# Altium footprint library Connectors.PcbLib: 268 footprints (part 19 of 21)
Each footprint in its own frame and in the unit in brackets; x right, y up, seen from the top. Pads: shape width x height; smd on the part's side, far side on the other; paste and mask are expansions set on the pad; w line width, h text height; cw(c..) or ccw(c..) is an arc to the next point about the centre after c.
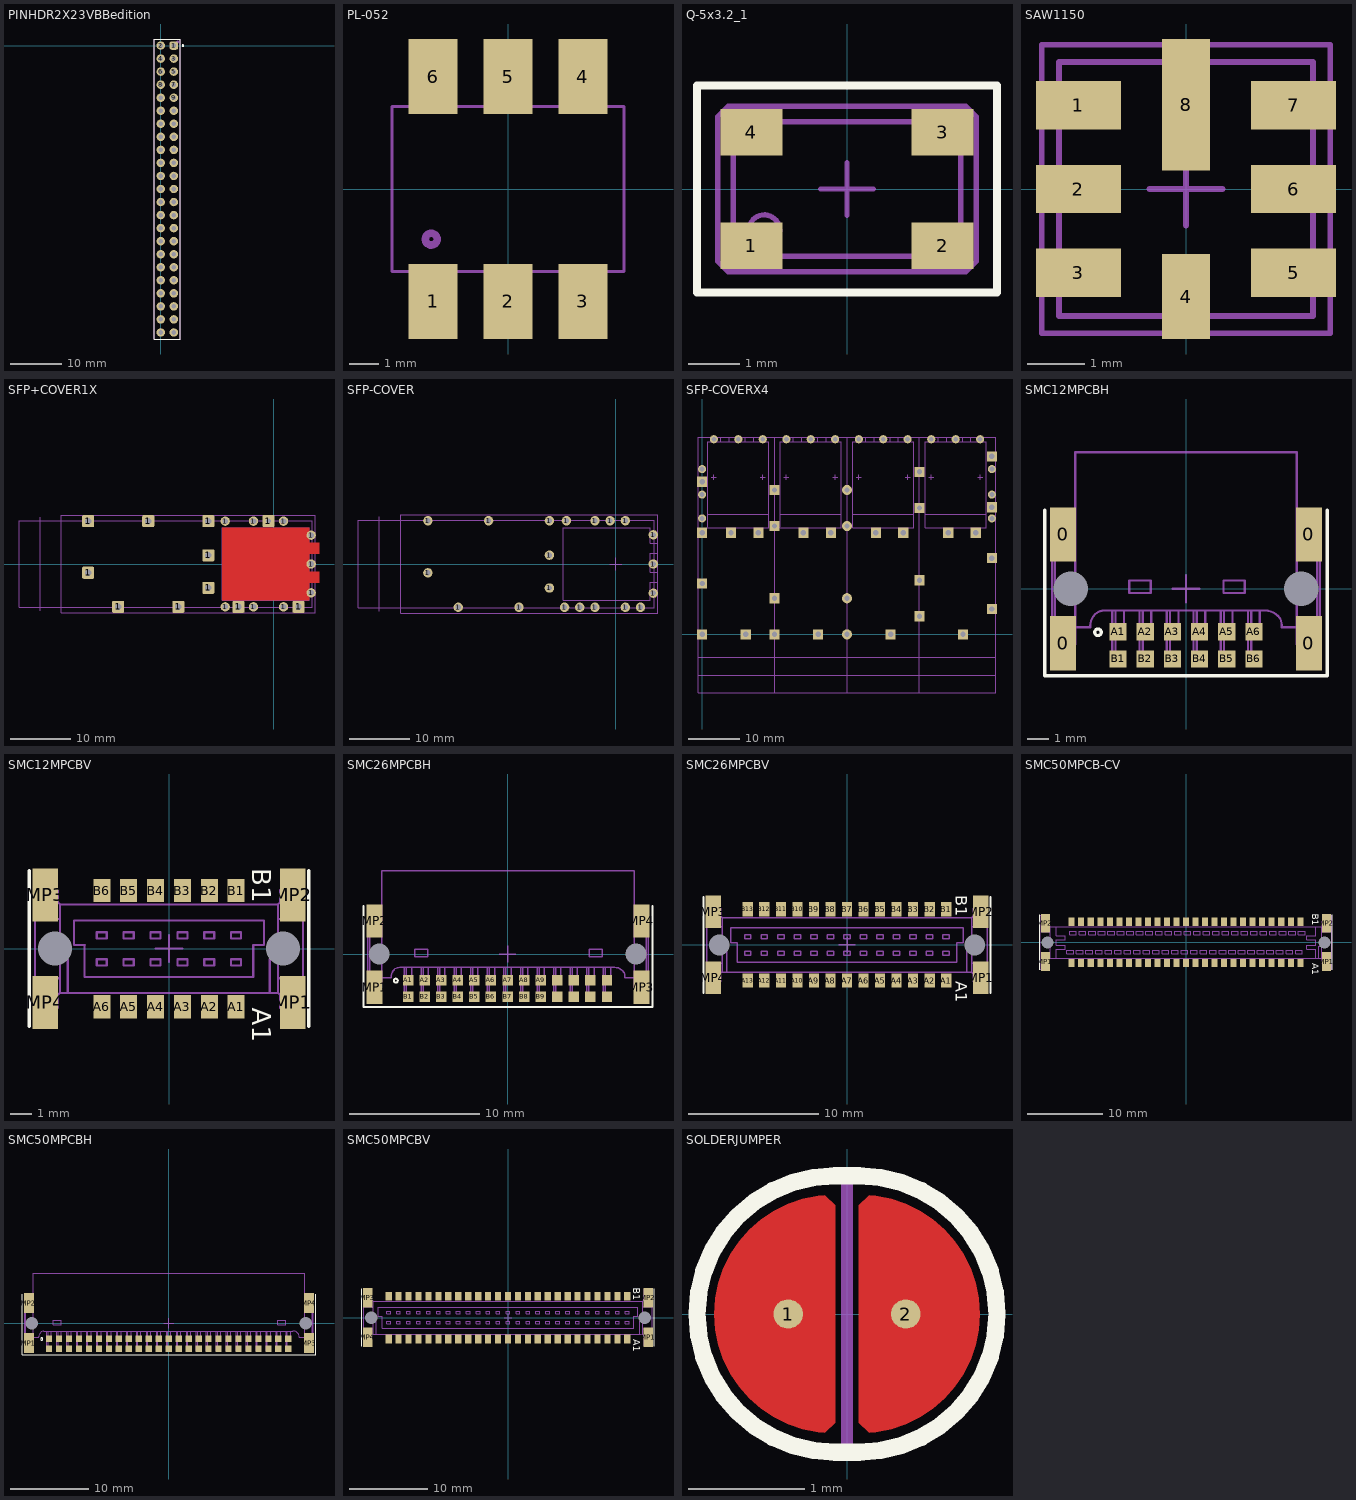
[diagram p18: the footprints below, top view; thin cyan lines are the x and y axes]

## PINHDR2X23VBBedition [mil] "Pin header 2x23 pin R2.54mm"
height 433.07
pads (46):
  rrect50% 65x65 hole 35.43 paste-50: 1(100,0)
  round 65 hole 35.43 paste-50: 2(0,0) 3(100,-100) 4(0,-100) 5(100,-200) 6(0,-200) 7(100,-300) 8(0,-300) 9(100,-400) 10(0,-400) 11(100,-500) 12(0,-500) 13(100,-600) 14(0,-600) 15(100,-700) 16(0,-700) 17(100,-800) 18(0,-800) 19(100,-900) 20(0,-900) 21(100,-1000) 22(0,-1000) 23(100,-1100) 24(0,-1100) 25(100,-1200) 26(0,-1200) 27(100,-1300) 28(0,-1300) 29(100,-1400) 30(0,-1400) 31(100,-1500) 32(0,-1500) 33(100,-1600) 34(0,-1600) 35(100,-1700) 36(0,-1700) 37(100,-1800) 38(0,-1800) 39(100,-1900) 40(0,-1900) 41(100,-2000) 42(0,-2000) 43(100,-2100) 44(0,-2100) 45(100,-2200) 46(0,-2200)
Top Overlay:
  circle w5.91: c170,0 r6
  lines w5.91: -50,-2250 -50,50 150,50 150,-2250 -50,-2250
Mechanical 13:
  drawing of 189 lines, arcs and shapes, not listed
3D body: height 314.96, standoff -125.98, extent 87,-1913 113,-1887
3D body: height 314.96, standoff -125.98, extent -13,-1913 13,-1887
3D body: height 314.96, standoff -125.98, extent -13,-1813 13,-1787
3D body: height 314.96, standoff -125.98, extent 87,-1813 113,-1787
3D body: height 314.96, standoff -125.98, extent -13,-1713 13,-1687
3D body: height 314.96, standoff -125.98, extent 87,-1713 113,-1687
3D body: height 314.96, standoff -125.98, extent -13,-1613 13,-1587
3D body: height 314.96, standoff -125.98, extent 87,-1613 113,-1587
3D body: height 314.96, standoff -125.98, extent -13,-1513 13,-1487
3D body: height 314.96, standoff -125.98, extent 87,-1513 113,-1487
3D body: height 314.96, standoff -125.98, extent -13,-1413 13,-1387
3D body: height 314.96, standoff -125.98, extent 87,-1413 113,-1387
3D body: height 314.96, standoff -125.98, extent -13,-1313 13,-1287
3D body: height 314.96, standoff -125.98, extent 87,-1313 113,-1287
3D body: height 314.96, standoff -125.98, extent -13,-1213 13,-1187
3D body: height 314.96, standoff -125.98, extent 87,-1213 113,-1187
3D body: height 314.96, standoff -125.98, extent -13,-1113 13,-1087
3D body: height 314.96, standoff -125.98, extent 87,-1113 113,-1087
3D body: height 314.96, standoff -125.98, extent -13,-1013 13,-987
3D body: height 314.96, standoff -125.98, extent 87,-1013 113,-987
3D body: height 314.96, standoff -125.98, extent -13,-913 13,-887
3D body: height 314.96, standoff -125.98, extent 87,-913 113,-887
3D body: height 314.96, standoff -125.98, extent -13,-813 13,-787
3D body: height 314.96, standoff -125.98, extent 87,-813 113,-787
3D body: height 314.96, standoff -125.98, extent -13,-713 13,-687
3D body: height 314.96, standoff -125.98, extent 87,-713 113,-687
3D body: height 314.96, standoff -125.98, extent -13,-613 13,-587
3D body: height 314.96, standoff -125.98, extent 87,-613 113,-587
3D body: height 314.96, standoff -125.98, extent -13,-513 13,-487
3D body: height 314.96, standoff -125.98, extent 87,-513 113,-487
3D body: height 314.96, standoff -125.98, extent -13,-413 13,-387
3D body: height 314.96, standoff -125.98, extent 87,-413 113,-387
3D body: height 314.96, standoff -125.98, extent -13,-313 13,-287
3D body: height 314.96, standoff -125.98, extent 87,-313 113,-287
3D body: height 314.96, standoff -125.98, extent -13,-213 13,-187
3D body: height 314.96, standoff -125.98, extent 87,-213 113,-187
3D body: height 314.96, standoff -125.98, extent -13,-113 13,-87
3D body: height 314.96, standoff -125.98, extent 87,-113 113,-87
3D body: height 100, standoff 0, extent -50,-2250 150,50
3D body: height 314.96, standoff -125.98, extent 87,-13 113,13
3D body: height 314.96, standoff -125.98, extent -13,-13 13,13
3D body: height 314.96, standoff -125.98, extent -13,-2013 13,-1987
3D body: height 314.96, standoff -125.98, extent 87,-2013 113,-1987
3D body: height 314.96, standoff -125.98, extent -13,-2113 13,-2087
3D body: height 314.96, standoff -125.98, extent 87,-2113 113,-2087
3D body: height 314.96, standoff -125.98, extent -13,-2213 13,-2187
3D body: height 314.96, standoff -125.98, extent 87,-2213 113,-2187

## PL-052 [mm] "RF Mixer"
height 2.84
pads (6):
  rect 1.65x2.54 smd: 1(-2.54,-3.81) 2(0,-3.81) 3(2.54,-3.81) 4(2.54,3.81) 5(0,3.81) 6(-2.54,3.81)
Mechanical 13:
  circle w0.254: c-2.6,-1.7 r0.2
  lines w0.102: -3.935,-2.795 3.935,-2.795 3.935,2.795 -3.935,2.795 -3.935,-2.795
3D body: height 2.84, standoff 0, extent -3.935,-2.795 3.935,2.795
3D body: height 2.85, standoff 2.84, extent -3.1,-2.2 -2.104,-1.202

## Q-5x3.2_1 [mm] "Quartz crystal 5x3.2x1.05mm"
height 1.05
pads (4):
  rect 1.2x0.9 smd: 1(-1.85,-1.1) 2(1.85,-1.1) 3(1.85,1.1) 4(-1.85,1.1)
Top Overlay:
  lines w0.15: -2.9,-2 2.9,-2 2.9,2 -2.9,2 -2.9,-2
Mechanical 13:
  circle w0.102: c-1.6,-0.8 r0.3
  lines w0.102: -2.5,-1.4 -2.5,1.4 -2.3,1.6 2.3,1.6 2.5,1.4 2.5,-1.4 2.3,-1.6 -2.3,-1.6 -2.5,-1.4 ; -2.2,-1.3 -2.2,1.3 2.2,1.3 2.2,-1.3 -2.2,-1.3
Mechanical 15:
  lines w0.102: -0.508,0 0.508,0 ; 0,-0.508 0,0.508
3D body: height 0.4, standoff 0, extent -2.5,-1.6 2.5,1.6
3D body: height 1.05, standoff 0.4, extent -2.2,-1.3 2.2,1.3
3D body: height 0.81, standoff 0.8, extent -2,-1.025 -1.5,-0.525
3D body: height 1.06, standoff 1.05, extent -1.9,-1.1 -1.3,-0.5

## RFTRF-KK81 [mm]
height 6.6

## SAW1150 [mm] "SAW filter 8 pin 5MM; R1.27mm"
height 1
pads (8):
  rect 1.47x0.84 smd: 1(-1.865,1.45) 2(-1.865,0) 3(-1.865,-1.45) 5(1.865,-1.45) 6(1.865,0) 7(1.865,1.45)
  rect 0.84x1.47 smd: 4(0,-1.865)
  rect 0.84x2.28 smd: 8(0,1.46)
Mechanical 13:
  lines w0.102: -2.5,-2.5 2.5,-2.5 2.5,2.5 -2.5,2.5 -2.5,-2.5
Mechanical 15:
  lines w0.102: -0.635,0 0.635,0 ; 0,-0.635 0,0.635 ; -2.2,-2.2 -2.2,2.2 2.2,2.2 2.2,-2.2 -2.2,-2.2
3D body: height 1.5, standoff 0, extent -2.5,-2.5 2.5,2.5
3D body: height 1.7, standoff 1.5, extent -2.2,-2.2 2.2,2.2
3D body: height 1.71, standoff 1.7, extent -1.798,1.201 -1.2,1.799

## SFP+COVER1X [mm] "SFP+ Cage Tyco 2007198-1"
height 10.4
pads (20):
  rrect20% 2x2 hole 1.05: 1(-30.9,-1.455) 1(-30.9,7.125) 1(-25.9,-7.125) 1(-20.9,7.125) 1(-15.9,-7.125) 1(-10.9,-3.955) 1(-10.9,1.445) 1(-10.9,7.125) 1(-5.9,-7.125) 1(4.1,-7.125)
  round 1.55 hole 0.95: 1(-8.1,-7.125) 1(-8.1,7.125) 1(-3.4,-7.125) 1(-3.4,7.125) 1(1.6,-7.125) 1(1.6,7.125) 1(6.2,-4.8) 1(6.2,0) 1(6.2,4.8)
  rrect20% 2x2 hole 0.85: 1(-0.9,7.125)
Top Layer:
  pour cut-out: 7.5,3.5 7.5,1.7 5.9,1.7 5.9,-1.3 7.5,-1.3 7.5,-3.1 5.9,-3.1 5.9,-6 -8.6,-6 -8.6,6 5.9,6 5.9,3.5
Mechanical 13:
  lines w0.102: -42.4,-7.2 6.35,-7.2 6.35,7.2 -42.4,7.2 -42.4,-7.2
Mechanical 15:
  lines w0.102: -38.9,-7.8 -38.9,7.8 ; -1,0 1,0 ; 0,-1 0,1 ; 6.9,-3 5.9,-3 5.9,-6 -8.6,-6 -8.6,3.8 -8.6,6 5.9,6 5.9,3.45 6.9,3.45 ; 6.9,-1.35 5.9,-1.35 5.9,1.75 6.9,1.75 ; -35.4,-8.1 -35.4,-7.2 -35.4,7.2 -35.4,8.1 6.9,8.1 6.9,-8.1 -35.4,-8.1
  text "CNSFP20" at -1,-4.3 h1.3
  text "center for" at -2.7,-6 h1.3
  text "PPL" at -37.2,-1.5 h1.4
  text "PCB" at -33.5,-1.9 h1.4
  text "GND only" at -18.1,-5.1 h1.3
3D body "c-2007198-1-a-3d.stp": height 10.47, standoff -2.98, extent -42.4,-8.008 6.4,8.008

## SFP-COVER [mm]
pads (20):
  round 1.55 hole 0.85: 1(-30.9,-1.45) 1(-30.9,7.125) 1(-25.9,-7.125) 1(-20.9,7.125) 1(-15.9,-7.125) 1(-10.9,-3.95) 1(-10.9,1.45) 1(-10.9,7.125) 1(-8.4,-7.125) 1(-8.1,7.125) 1(-5.9,-7.125) 1(-3.4,-7.125) 1(-3.4,7.125) 1(-0.9,7.125) 1(1.6,-7.125) 1(1.6,7.125) 1(4.1,-7.125) 1(6.2,-4.8) 1(6.2,0) 1(6.2,4.8)
Mechanical 13:
  lines w0.102: -42.4,-7.2 6.35,-7.2 6.35,7.2 -42.4,7.2 -42.4,-7.2
Mechanical 15:
  lines w0.102: -38.9,-7.8 -38.9,7.8 ; -1,0 1,0 ; 0,-1 0,1 ; 6.9,-3 5.7,-3 5.7,-6 -8.6,-6 -8.6,3.8 -8.6,6 5.7,6 5.7,3.45 6.9,3.45 ; 6.9,-1.35 5.7,-1.35 5.7,1.75 6.9,1.75 ; -35.4,-8.1 -35.4,-7.2 -35.4,7.2 -35.4,8.1 6.9,8.1 6.9,-8.1 -35.4,-8.1
  text "CNSFP20" at -1,-4.3 h1.3
  text "center for" at -2.7,-6 h1.3
  text "PPL" at -37.2,-1.5 h1.4
  text "PCB" at -33.5,-1.9 h1.4
  text "GND only" at -18.1,-5.1 h1.3
3D body: height 9.25, standoff 0.3, extent -42.4,-7.2 6.35,7.2
3D body: height 9.55, standoff 9.25, extent -42.4,-7.2 6.35,7.2
3D body: height 0.3, standoff 0, extent -42.4,-7.2 6.35,7.2

## SFP-COVERX4 [mm]
pads (50):
  rect 2x2 hole 1.05: MH1(0,0) MH1(0,10) MH1(0,20) MH1(0,30) MH1(5.675,20) MH1(8.575,0) MH1(11.075,20) MH1(14.25,0) MH1(14.25,7.1) MH1(14.25,21.3) MH1(14.25,28.4) MH1(19.925,20) MH1(22.825,0) MH1(25.325,20) MH1(34.175,20) MH1(37.075,0) MH1(39.575,20) MH1(42.75,3.55) MH1(42.75,10.65) MH1(42.75,24.85) MH1(42.75,31.95) MH1(48.425,20) MH1(51.325,0) MH1(53.825,20) MH1(57,5) MH1(57,15) MH1(57,25) MH1(57,35)
  round 1.6 hole 0.95: MH1(0,22.8) MH1(0,27.5) MH1(0,32.5) MH1(2.325,38.375) MH1(7.125,38.375) MH1(11.925,38.375) MH1(16.575,38.375) MH1(21.375,38.375) MH1(26.175,38.375) MH1(30.825,38.375) MH1(35.625,38.375) MH1(40.425,38.375) MH1(45.075,38.375) MH1(49.875,38.375) MH1(54.675,38.375) MH1(57,22.8) MH1(57,27.5) MH1(57,32.5)
  round 2 hole 1.05: MH1(28.5,0) MH1(28.5,7.1) MH1(28.5,21.3) MH1(28.5,28.4)
Mechanical 13:
  lines w0.127: 14.25,-11.5 14.25,38.8 ; 28.5,-11.5 28.5,38.8 ; 42.75,-11.5 42.75,38.8 ; -0.8,-11.5 57.8,-11.5 57.8,38.8 -0.8,38.8 -0.8,-11.5 ; 1,21 1.125,21.125 1.125,37.875 13.125,37.875 13.125,21 1,21 ; 15.25,21 15.375,21.125 15.375,37.875 27.375,37.875 27.375,21 15.25,21 ; 29.625,21 41.625,21 41.625,37.875 29.625,37.875 29.625,21 ; 43.875,21 55.875,21 55.875,37.875 43.875,37.875 43.875,21
Mechanical 15:
  lines w0.102: 3.675,38.8 3.675,37.875 1.125,37.875 1.125,23.575 3.325,23.575 13.125,23.575 13.125,37.875 10.125,37.875 10.125,38.8 ; 5.375,38.8 5.375,37.875 8.475,37.875 8.475,38.8 ; 17.925,38.8 17.925,37.875 15.375,37.875 15.375,23.575 17.575,23.575 27.375,23.575 27.375,37.875 24.375,37.875 24.375,38.8 ; 19.625,38.8 19.625,37.875 22.725,37.875 22.725,38.8 ; 32.175,38.8 32.175,37.875 29.625,37.875 29.625,23.575 31.825,23.575 41.625,23.575 41.625,37.875 38.625,37.875 38.625,38.8 ; 33.875,38.8 33.875,37.875 36.975,37.875 36.975,38.8 ; 46.425,38.8 46.425,37.875 43.875,37.875 43.875,23.575 46.075,23.575 55.875,23.575 55.875,37.875 52.875,37.875 52.875,38.8 ; 48.125,38.8 48.125,37.875 51.225,37.875 51.225,38.8
  lines w0.127: -0.8,-8 57.8,-8 ; 1.825,30.9 2.825,30.9 ; 2.325,30.4 2.325,31.4 ; 11.425,30.9 12.425,30.9 ; 11.925,30.4 11.925,31.4 ; 16.075,30.9 17.075,30.9 ; 16.575,30.4 16.575,31.4 ; 25.675,30.9 26.675,30.9 ; 26.175,30.4 26.175,31.4 ; 30.325,30.9 31.325,30.9 ; 30.825,30.4 30.825,31.4 ; 39.925,30.9 40.925,30.9 ; 40.425,30.4 40.425,31.4 ; 44.575,30.9 45.575,30.9 ; 45.075,30.4 45.075,31.4 ; 54.175,30.9 55.175,30.9 ; 54.675,30.4 54.675,31.4 ; -0.8,-4.5 57.8,-4.5 57.8,38.8 -0.8,38.8 -0.8,-4.5
  text "Front Panel inner edge" at 43.1,-6.3 h1.3
  text "GND only" at 12.1,11.7 h1.3
  text "center for" at 13,27.1 h1.3
  text "CNSFP20" at 11.3,28.8 h1.3
  text "CNSFP20" at 25.55,28.8 h1.3
  text "center for" at 27.25,27.1 h1.3
  text "GND only" at 26.35,11.7 h1.3
  text "CNSFP20" at 39.8,28.8 h1.3
  text "center for" at 41.5,27.1 h1.3
  text "GND only" at 40.6,11.7 h1.3
  text "CNSFP20" at 54.05,28.8 h1.3
  text "center for" at 55.75,27.1 h1.3
  text "GND only" at 54.85,11.7 h1.3
  text "PCB edge" at 33.2,-2.7 h1.3
3D body "c-1658744-1-e1-3d.stp": height 10.38, standoff -2.03, extent -0.787,-11.5 57.8,38.75

## SMC12MPCBH [mm] "ERNI SMC12 pin MALE HOR"
height 4.2
pads (18):
  rect 1.219x2.54 smd: 0(-5.74,-2.54) 0(-5.74,2.54) 0(5.74,-2.54) 0(5.74,2.54)
  rect 0.8x0.8 smd: A1(-3.175,-2.007) A2(-1.905,-2.007) A3(-0.635,-2.007) A4(0.635,-2.007) A5(1.905,-2.007) A6(3.175,-2.007) B1(-3.175,-3.277) B2(-1.905,-3.277) B3(-0.635,-3.277) B4(0.635,-3.277) B5(1.905,-3.277) B6(3.175,-3.277)
  round 0 hole 1.6 unplated: MH1(-5.385,0) MH2(5.385,0)
Top Overlay:
  circle w0.15: c-4.115,-2.032 r0.152
  lines w0.15: -6.604,3.683 -6.604,-4.064 6.604,-4.064 6.604,3.683
Mechanical 13:
  lines w0.102: -5.175,-1.419 -6.125,-1.419 -6.125,1.381 -5.175,1.381 ; -5.175,3.581 -6.25,3.581 -6.25,-3.619 -5.275,-3.619 -5.275,-2.694 -5.175,-2.594 -5.175,-1.794 ; -3.45,-1.019 -3.45,-3.519 -2.9,-3.519 -2.9,-3.019 -3.3,-3.019 ; -3.3,-3.519 -3.3,-1.019 ; -3.3,-2.244 -2.9,-2.244 -2.9,-1.019 ; -3.3,-1.819 -2.9,-1.819 ; -2.175,-1.019 -2.175,-3.519 -1.625,-3.519 -1.625,-3.019 -2.025,-3.019 ; -2.025,-3.519 -2.025,-1.019 ; -2.025,-2.244 -1.625,-2.244 -1.625,-1.019 ; -2.025,-1.819 -1.625,-1.819 ; -0.9,-1.019 -0.9,-3.519 -0.35,-3.519 -0.35,-3.019 -0.75,-3.019 ; -0.75,-3.519 -0.75,-1.019 ; -0.75,-2.244 -0.35,-2.244 -0.35,-1.019 ; -0.75,-1.819 -0.35,-1.819 ; 0.35,-1.019 0.35,-3.519 0.9,-3.519 0.9,-3.019 0.5,-3.019 ; 0.5,-3.519 0.5,-1.019 ; 0.5,-2.244 0.9,-2.244 0.9,-1.019 ; 0.5,-1.819 0.9,-1.819 ; 1.625,-1.019 1.625,-3.519 2.175,-3.519 2.175,-3.019 1.775,-3.019 ; 1.775,-3.519 1.775,-1.019 ; 1.775,-2.244 2.175,-2.244 2.175,-1.019 ; 1.775,-1.819 2.175,-1.819 ; 2.9,-1.019 2.9,-3.519 3.45,-3.519 3.45,-3.019 3.05,-3.019 ; 3.05,-3.519 3.05,-1.019 ; 3.05,-2.244 3.45,-2.244 3.45,-1.019 ; 3.05,-1.819 3.45,-1.819 ; 5.175,-1.419 6.125,-1.419 6.125,1.381 5.175,1.381 ; 5.175,3.581 6.25,3.581 6.25,-3.619 5.275,-3.619 5.275,-2.694 5.175,-2.594 5.175,-1.794 ; -5.175,-1.794 -4.475,-1.794 -4.475,-1.737 cw(c-3.707,-1.737) -4.25,-1.194 cw(c-3.828,-1.616) -3.828,-1.019 3.696,-1.019 cw(c3.696,-1.873) 4.3,-1.269 cw(c3.878,-1.691) 4.475,-1.691 4.475,-1.794 5.175,-1.794 ; -5.175,-1.794 -5.175,6.381 5.175,6.381 5.175,-1.794 ; -2.65,-0.194 -2.65,0.381 -1.65,0.381 -1.65,-0.194 -2.65,-0.194 ; 1.75,-0.194 1.75,0.381 2.75,0.381 2.75,-0.194 1.75,-0.194
Mechanical 15:
  lines w0.102: -0.635,0 0.635,0 ; 0,-0.635 0,0.635
3D body "SMC12MH.stp": height 4.27, standoff -0.68, extent -6.285,-3.625 6.285,6.375

## SMC12MPCBV [mm] "ERNI SMC12 pin MALE VERT"
height 8
pads (18):
  rect 0.8x1.1 smd: A1(3.175,-2.743) A2(1.905,-2.743) A3(0.635,-2.743) A4(-0.635,-2.743) A5(-1.905,-2.743) A6(-3.175,-2.743) B1(3.175,2.743) B2(1.905,2.743) B3(0.635,2.743) B4(-0.635,2.743) B5(-1.905,2.743) B6(-3.175,2.743)
  round 0 hole 1.6 unplated: MH1(-5.385,0) MH2(5.385,0)
  rect 1.2x2.5 smd: MP1(5.842,-2.54) MP2(5.842,2.54) MP3(-5.842,2.54) MP4(-5.842,-2.54)
Top Overlay:
  lines w0.15: -6.604,-3.683 -6.604,3.683 ; 6.604,-3.683 6.604,3.683
  text "A1" at 3.937,-2.794 h0.89
  text "B1" at 3.937,3.81 h0.89
Mechanical 13:
  lines w0.102: -6.335,-1.4 -5.16,-1.4 ; -6.335,1.4 -5.16,1.4 ; -5.16,-0.525 -4.785,-0.525 -4.785,-2.1 ; -5.156,-2.1 5.16,-2.1 ; -5.156,2.083 5.16,2.083 ; -4.485,1.325 -4.485,0.175 -3.985,0.175 ; -4.47,1.325 4.485,1.325 4.485,0.175 3.985,0.175 3.985,-1.35 -3.988,-1.35 ; -3.988,-1.346 -3.988,0.178 ; 4.76,-2.1 4.76,-0.5 5.16,-0.5 ; 5.16,-1.4 6.335,-1.4 ; 5.16,1.4 6.335,1.4 ; 5.16,-2.1 5.16,2.1 5.26,2.2 5.26,2.775 5.335,2.85 5.335,3.6 6.335,3.6 6.335,-3.6 5.335,-3.6 5.335,-2.875 5.26,-2.8 5.26,-2.2 5.16,-2.1 ; -6.335,-3.6 -6.335,3.6 -5.335,3.6 -5.335,2.85 -5.26,2.775 -5.26,2.2 -5.16,2.1 -5.16,-2.1 -5.26,-2.2 -5.26,-2.8 -5.335,-2.875 -5.335,-3.6 -6.335,-3.6 ; -3.415,-0.8 -3.415,-0.5 -2.94,-0.5 -2.94,-0.8 -3.415,-0.8 ; -3.415,0.475 -2.94,0.475 -2.94,0.775 -3.415,0.775 -3.415,0.475 ; -2.145,-0.8 -2.145,-0.5 -1.67,-0.5 -1.67,-0.8 -2.145,-0.8 ; -2.145,0.475 -1.67,0.475 -1.67,0.775 -2.145,0.775 -2.145,0.475 ; -0.875,-0.8 -0.875,-0.5 -0.4,-0.5 -0.4,-0.8 -0.875,-0.8 ; -0.875,0.475 -0.4,0.475 -0.4,0.775 -0.875,0.775 -0.875,0.475 ; 0.395,-0.8 0.395,-0.5 0.87,-0.5 0.87,-0.8 0.395,-0.8 ; 0.395,0.475 0.87,0.475 0.87,0.775 0.395,0.775 0.395,0.475 ; 1.665,-0.8 1.665,-0.5 2.14,-0.5 2.14,-0.8 1.665,-0.8 ; 1.665,0.475 2.14,0.475 2.14,0.775 1.665,0.775 1.665,0.475 ; 2.935,-0.8 3.41,-0.8 3.41,-0.5 2.935,-0.5 2.935,-0.8 ; 2.935,0.475 2.935,0.775 3.41,0.775 3.41,0.475 2.935,0.475
Mechanical 15:
  lines w0.102: -0.635,0 0.635,0 ; 0,-0.635 0,0.635
3D body "154818_NEU.stp": height 6.75, standoff -0.75, extent -6.35,-3.6 6.35,3.6

## SMC26MPCBH [mm] "ERNI SMC26 pin MALE HOR"
height 4.2
pads (32):
  rect 0.8x0.8 smd: A1(-7.62,-2.007) A2(-6.35,-2.007) A3(-5.08,-2.007) A4(-3.81,-2.007) A5(-2.54,-2.007) A6(-1.27,-2.007) A7(0,-2.007) A8(1.27,-2.007) A9(2.54,-2.007) A10(3.81,-2.007) A11(5.08,-2.007) A12(6.35,-2.007) A13(7.62,-2.007) B1(-7.62,-3.277) B2(-6.35,-3.277) B3(-5.08,-3.277) B4(-3.81,-3.277) B5(-2.54,-3.277) B6(-1.27,-3.277) B7(0,-3.277) B8(1.27,-3.277) B9(2.54,-3.277) B10(3.81,-3.277) B11(5.08,-3.277) B12(6.35,-3.277) B13(7.62,-3.277)
  round 0 hole 1.6 unplated: MH1(-9.83,0) MH2(9.83,0)
  rect 1.219x2.54 smd: MP1(-10.185,-2.54) MP2(-10.185,2.54) MP3(10.255,-2.54) MP4(10.255,2.54)
Top Overlay:
  circle w0.15: c-8.56,-2.032 r0.152
  lines w0.15: -11.049,3.683 -11.049,-4.064 11.119,-4.064 11.119,3.683
Mechanical 13:
  lines w0.102: -9.62,-1.419 -10.57,-1.419 -10.57,1.381 -9.62,1.381 ; -9.62,3.581 -10.695,3.581 -10.695,-3.619 -9.72,-3.619 -9.72,-2.694 -9.62,-2.594 -9.62,-1.794 ; -7.895,-1.019 -7.895,-3.519 -7.345,-3.519 -7.345,-3.019 -7.745,-3.019 ; -7.745,-3.519 -7.745,-1.019 ; -7.745,-2.244 -7.345,-2.244 -7.345,-1.019 ; -7.745,-1.819 -7.345,-1.819 ; -6.62,-1.019 -6.62,-3.519 -6.07,-3.519 -6.07,-3.019 -6.47,-3.019 ; -6.47,-3.519 -6.47,-1.019 ; -6.47,-2.244 -6.07,-2.244 -6.07,-1.019 ; -6.47,-1.819 -6.07,-1.819 ; -5.345,-1.019 -5.345,-3.519 -4.795,-3.519 -4.795,-3.019 -5.195,-3.019 ; -5.195,-3.519 -5.195,-1.019 ; -5.195,-2.244 -4.795,-2.244 -4.795,-1.019 ; -5.195,-1.819 -4.795,-1.819 ; -4.095,-1.019 -4.095,-3.519 -3.545,-3.519 -3.545,-3.019 -3.945,-3.019 ; -3.945,-3.519 -3.945,-1.019 ; -3.945,-2.244 -3.545,-2.244 -3.545,-1.019 ; -3.945,-1.819 -3.545,-1.819 ; -2.82,-1.019 -2.82,-3.519 -2.27,-3.519 -2.27,-3.019 -2.67,-3.019 ; -2.67,-3.519 -2.67,-1.019 ; -2.67,-2.244 -2.27,-2.244 -2.27,-1.019 ; -2.67,-1.819 -2.27,-1.819 ; -1.545,-1.019 -1.545,-3.519 -0.995,-3.519 -0.995,-3.019 -1.395,-3.019 ; -1.395,-3.519 -1.395,-1.019 ; -1.395,-2.244 -0.995,-2.244 -0.995,-1.019 ; -1.395,-1.819 -0.995,-1.819 ; -0.275,-1.019 -0.275,-3.519 0.275,-3.519 0.275,-3.019 -0.125,-3.019 ; -0.125,-3.519 -0.125,-1.019 ; -0.125,-2.244 0.275,-2.244 0.275,-1.019 ; -0.125,-1.819 0.275,-1.819 ; 1,-1.019 1,-3.519 1.55,-3.519 1.55,-3.019 1.15,-3.019 ; 1.15,-3.519 1.15,-1.019 ; 1.15,-2.244 1.55,-2.244 1.55,-1.019 ; 1.15,-1.819 1.55,-1.819 ; 2.275,-1.019 2.275,-3.519 2.825,-3.519 2.825,-3.019 2.425,-3.019 ; 2.425,-3.519 2.425,-1.019 ; 2.425,-2.244 2.825,-2.244 2.825,-1.019 ; 2.425,-1.819 2.825,-1.819 ; 3.525,-1.019 3.525,-3.519 4.075,-3.519 4.075,-3.019 3.675,-3.019 ; 3.675,-3.519 3.675,-1.019 ; 3.675,-2.244 4.075,-2.244 4.075,-1.019 ; 3.675,-1.819 4.075,-1.819 ; 4.8,-1.019 4.8,-3.519 5.35,-3.519 5.35,-3.019 4.95,-3.019 ; 4.95,-3.519 4.95,-1.019 ; 4.95,-2.244 5.35,-2.244 5.35,-1.019 ; 4.95,-1.819 5.35,-1.819 ; 6.075,-1.019 6.075,-3.519 6.625,-3.519 6.625,-3.019 6.225,-3.019 ; 6.225,-3.519 6.225,-1.019 ; 6.225,-2.244 6.625,-2.244 6.625,-1.019 ; 6.225,-1.819 6.625,-1.819 ; 7.345,-1.019 7.345,-3.519 7.895,-3.519 7.895,-3.019 7.495,-3.019 ; 7.495,-3.519 7.495,-1.019 ; 7.495,-2.244 7.895,-2.244 7.895,-1.019 ; 7.495,-1.819 7.895,-1.819 ; 9.69,-1.419 10.64,-1.419 10.64,1.381 9.69,1.381 ; 9.69,3.581 10.765,3.581 10.765,-3.619 9.79,-3.619 9.79,-2.694 9.69,-2.594 9.69,-1.794 ; -9.62,-1.794 -8.92,-1.794 -8.92,-1.737 cw(c-8.152,-1.737) -8.695,-1.194 cw(c-8.273,-1.616) -8.273,-1.019 8.211,-1.019 cw(c8.211,-1.873) 8.815,-1.269 cw(c8.393,-1.691) 8.99,-1.691 8.99,-1.794 9.69,-1.794 ; -9.62,-1.794 -9.62,6.381 9.69,6.381 9.69,-1.794 ; -7.095,-0.194 -7.095,0.381 -6.095,0.381 -6.095,-0.194 -7.095,-0.194 ; 6.265,-0.194 7.265,-0.194 7.265,0.381 6.265,0.381 6.265,-0.194
Mechanical 15:
  lines w0.102: -0.635,0 0.635,0 ; 0,-0.635 0,0.635
3D body "SMC-054595.stp": height 4.27, standoff -0.68, extent -10.73,-3.599 10.73,6.401

## SMC26MPCBV [mm] "ERNI SMC26 pin MALE VERT"
height 8
pads (32):
  rect 0.8x1.1 smd: A1(7.62,-2.743) A2(6.35,-2.743) A3(5.08,-2.743) A4(3.81,-2.743) A5(2.54,-2.743) A6(1.27,-2.743) A7(0,-2.743) A8(-1.27,-2.743) A9(-2.54,-2.743) A10(-3.81,-2.743) A11(-5.08,-2.743) A12(-6.35,-2.743) A13(-7.62,-2.743) B1(7.62,2.743) B2(6.35,2.743) B3(5.08,2.743) B4(3.81,2.743) B5(2.54,2.743) B6(1.27,2.743) B7(0,2.743) B8(-1.27,2.743) B9(-2.54,2.743) B10(-3.81,2.743) B11(-5.08,2.743) B12(-6.35,2.743) B13(-7.62,2.743)
  round 0 hole 1.6 unplated: MH1(-9.83,0) MH2(9.83,0)
  rect 1.2x2.5 smd: MP1(10.287,-2.54) MP2(10.287,2.54) MP3(-10.287,2.54) MP4(-10.287,-2.54)
Top Overlay:
  lines w0.15: -11.049,-3.683 -11.049,3.683 ; 11.049,-3.683 11.049,3.683
  text "B1" at 8.382,3.81 h0.89
  text "A1" at 8.382,-2.794 h0.89
Mechanical 13:
  lines w0.102: -10.78,-1.4 -9.605,-1.4 ; -10.78,1.4 -9.605,1.4 ; -9.655,-2.1 9.605,-2.1 ; -9.605,-0.525 -9.23,-0.525 -9.23,-2.1 ; -9.605,2.083 9.605,2.083 ; -8.433,-1.35 8.43,-1.35 8.43,0.175 8.93,0.175 8.93,1.325 -8.93,1.325 -8.93,0.175 -8.43,0.175 ; -8.433,-1.346 -8.433,0.178 ; 9.205,-2.1 9.205,-0.5 9.605,-0.5 ; 9.605,-1.4 10.78,-1.4 ; 9.605,1.4 10.78,1.4 ; 9.605,-2.1 9.705,-2.2 9.705,-2.8 9.78,-2.875 9.78,-3.6 10.78,-3.6 10.78,3.6 9.78,3.6 9.78,2.85 9.705,2.775 9.705,2.2 9.605,2.1 9.605,-2.1 ; -10.78,-3.6 -9.78,-3.6 -9.78,-2.875 -9.705,-2.8 -9.705,-2.2 -9.605,-2.1 -9.605,2.1 -9.705,2.2 -9.705,2.775 -9.78,2.85 -9.78,3.6 -10.78,3.6 -10.78,-3.6 ; -7.86,-0.8 -7.86,-0.5 -7.385,-0.5 -7.385,-0.8 -7.86,-0.8 ; -7.86,0.475 -7.385,0.475 -7.385,0.775 -7.86,0.775 -7.86,0.475 ; -6.59,-0.8 -6.59,-0.5 -6.115,-0.5 -6.115,-0.8 -6.59,-0.8 ; -6.59,0.475 -6.115,0.475 -6.115,0.775 -6.59,0.775 -6.59,0.475 ; -5.32,-0.8 -5.32,-0.5 -4.845,-0.5 -4.845,-0.8 -5.32,-0.8 ; -5.32,0.475 -4.845,0.475 -4.845,0.775 -5.32,0.775 -5.32,0.475 ; -4.05,-0.8 -4.05,-0.5 -3.575,-0.5 -3.575,-0.8 -4.05,-0.8 ; -4.05,0.475 -3.575,0.475 -3.575,0.775 -4.05,0.775 -4.05,0.475 ; -2.78,-0.8 -2.78,-0.5 -2.305,-0.5 -2.305,-0.8 -2.78,-0.8 ; -2.78,0.475 -2.305,0.475 -2.305,0.775 -2.78,0.775 -2.78,0.475 ; -1.51,-0.8 -1.51,-0.5 -1.035,-0.5 -1.035,-0.8 -1.51,-0.8 ; -1.51,0.475 -1.035,0.475 -1.035,0.775 -1.51,0.775 -1.51,0.475 ; -0.24,-0.8 -0.24,-0.5 0.235,-0.5 0.235,-0.8 -0.24,-0.8 ; -0.24,0.475 0.235,0.475 0.235,0.775 -0.24,0.775 -0.24,0.475 ; 1.03,-0.8 1.505,-0.8 1.505,-0.5 1.03,-0.5 1.03,-0.8 ; 1.03,0.475 1.03,0.775 1.505,0.775 1.505,0.475 1.03,0.475 ; 2.3,-0.8 2.775,-0.8 2.775,-0.5 2.3,-0.5 2.3,-0.8 ; 2.3,0.475 2.3,0.775 2.775,0.775 2.775,0.475 2.3,0.475 ; 3.57,-0.8 4.045,-0.8 4.045,-0.5 3.57,-0.5 3.57,-0.8 ; 3.57,0.475 3.57,0.775 4.045,0.775 4.045,0.475 3.57,0.475 ; 4.84,-0.8 5.315,-0.8 5.315,-0.5 4.84,-0.5 4.84,-0.8 ; 4.84,0.475 4.84,0.775 5.315,0.775 5.315,0.475 4.84,0.475 ; 6.11,-0.8 6.585,-0.8 6.585,-0.5 6.11,-0.5 6.11,-0.8 ; 6.11,0.475 6.11,0.775 6.585,0.775 6.585,0.475 6.11,0.475 ; 7.38,-0.8 7.38,-0.5 7.855,-0.5 7.855,-0.8 7.38,-0.8 ; 7.38,0.475 7.855,0.475 7.855,0.775 7.38,0.775 7.38,0.475
Mechanical 15:
  lines w0.102: -0.635,0 0.635,0 ; 0,-0.635 0,0.635
3D body "154819_NEU.stp": height 6.77, standoff -0.73, extent -10.795,-3.6 10.795,3.6

## SMC50MPCB-CV [mm] "ERNI SMT50pin CABLE on BOARD"
height 5
pads (56):
  rect 0.8x1.1 smd: A1(15.24,-2.75) A2(13.97,-2.75) A3(12.7,-2.75) A4(11.43,-2.75) A5(10.16,-2.75) A6(8.89,-2.75) A7(7.62,-2.75) A8(6.35,-2.75) A9(5.08,-2.75) A10(3.81,-2.75) A11(2.54,-2.75) A12(1.27,-2.75) A13(0,-2.75) A14(-1.27,-2.75) A15(-2.54,-2.75) A16(-3.81,-2.75) A17(-5.08,-2.75) A18(-6.35,-2.75) A19(-7.62,-2.75) A20(-8.89,-2.75) A21(-10.16,-2.75) A22(-11.43,-2.75) A23(-12.7,-2.75) A24(-13.97,-2.75) A25(-15.24,-2.75) B1(15.24,2.75) B2(13.97,2.75) B3(12.7,2.75) B4(11.43,2.75) B5(10.16,2.75) B6(8.89,2.75) B7(7.62,2.75) B8(6.35,2.75) B9(5.08,2.75) B10(3.81,2.75) B11(2.54,2.75) B12(1.27,2.75) B13(0,2.75) B14(-1.27,2.75) B15(-2.54,2.75) B16(-3.81,2.75) B17(-5.08,2.75) B18(-6.35,2.75) B19(-7.62,2.75) B20(-8.89,2.75) B21(-10.16,2.75) B22(-11.43,2.75) B23(-12.7,2.75) B24(-13.97,2.75) B25(-15.24,2.75)
  round 0 hole 1.6 unplated: MH1(18.45,0) MH2(-18.45,0)
  rect 1.2x2.5 smd: MP1(-18.75,-2.55) MP1(18.75,-2.55) MP2(-18.75,2.55) MP2(18.75,2.55)
Top Overlay:
  lines w0.15: -19.532,-3.651 -19.532,3.715 ; 19.532,-3.651 19.532,3.715
  text "A1" at 16.865,-2.762 h0.89
  text "B1" at 16.865,3.842 h0.89
Mechanical 13:
  drawing of 250 lines, arcs and shapes, not listed
3D body: height 1, standoff 0, extent -15.494,-3.175 -14.986,-2.1
3D body: height 1, standoff 0, extent -14.224,-3.175 -13.716,-2.1
3D body: height 1, standoff 0, extent -12.954,-3.175 -12.446,-2.1
3D body: height 1, standoff 0, extent -11.684,-3.175 -11.176,-2.1
3D body: height 1, standoff 0, extent -10.414,-3.175 -9.906,-2.1
3D body: height 1, standoff 0, extent -9.144,-3.175 -8.636,-2.1
3D body: height 1, standoff 0, extent -7.874,-3.175 -7.366,-2.1
3D body: height 1, standoff 0, extent -6.604,-3.175 -6.096,-2.1
3D body: height 1, standoff 0, extent -5.334,-3.175 -4.826,-2.1
3D body: height 1, standoff 0, extent -4.064,-3.175 -3.556,-2.1
3D body: height 1, standoff 0, extent -2.794,-3.175 -2.286,-2.1
3D body: height 1, standoff 0, extent -1.524,-3.175 -1.016,-2.1
3D body: height 1, standoff 0, extent -0.254,-3.175 0.254,-2.1
3D body: height 1, standoff 0, extent 1.016,-3.175 1.524,-2.1
3D body: height 1, standoff 0, extent 2.286,-3.175 2.794,-2.1
3D body: height 1, standoff 0, extent 3.556,-3.175 4.064,-2.1
3D body: height 1, standoff 0, extent 4.826,-3.175 5.334,-2.1
3D body: height 1, standoff 0, extent 6.096,-3.175 6.604,-2.1
3D body: height 1, standoff 0, extent 7.366,-3.175 7.874,-2.1
3D body: height 1, standoff 0, extent 8.636,-3.175 9.144,-2.1
3D body: height 1, standoff 0, extent 9.906,-3.175 10.414,-2.1
3D body: height 1, standoff 0, extent 11.176,-3.175 11.684,-2.1
3D body: height 1, standoff 0, extent 12.446,-3.175 12.954,-2.1
3D body: height 1, standoff 0, extent 13.716,-3.175 14.224,-2.1
3D body: height 1, standoff 0, extent 14.986,-3.175 15.494,-2.1
3D body: height 1, standoff 0, extent 14.986,2.1 15.494,3.175
3D body: height 1, standoff 0, extent 13.716,2.1 14.224,3.175
3D body: height 1, standoff 0, extent 12.446,2.1 12.954,3.175
3D body: height 1, standoff 0, extent 11.176,2.1 11.684,3.175
3D body: height 1, standoff 0, extent 9.906,2.1 10.414,3.175
3D body: height 1, standoff 0, extent 8.636,2.1 9.144,3.175
3D body: height 1, standoff 0, extent 7.366,2.1 7.874,3.175
3D body: height 1, standoff 0, extent 6.096,2.1 6.604,3.175
3D body: height 1, standoff 0, extent 4.826,2.1 5.334,3.175
3D body: height 1, standoff 0, extent 3.556,2.1 4.064,3.175
3D body: height 1, standoff 0, extent 2.286,2.1 2.794,3.175
3D body: height 1, standoff 0, extent 1.016,2.1 1.524,3.175
3D body: height 1, standoff 0, extent -0.254,2.1 0.254,3.175
3D body: height 1, standoff 0, extent -1.524,2.1 -1.016,3.175
3D body: height 1, standoff 0, extent -2.794,2.1 -2.286,3.175
3D body: height 1, standoff 0, extent -4.064,2.1 -3.556,3.175
3D body: height 1, standoff 0, extent -5.334,2.1 -4.826,3.175
3D body: height 1, standoff 0, extent -6.604,2.1 -6.096,3.175
3D body: height 1, standoff 0, extent -7.874,2.1 -7.366,3.175
3D body: height 1, standoff 0, extent -9.144,2.1 -8.636,3.175
3D body: height 1, standoff 0, extent -10.414,2.1 -9.906,3.175
3D body: height 1, standoff 0, extent -11.684,2.1 -11.176,3.175
3D body: height 1, standoff 0, extent -12.954,2.1 -12.446,3.175
3D body: height 1, standoff 0, extent -14.224,2.1 -13.716,3.175
3D body: height 1, standoff 0, extent -15.494,2.1 -14.986,3.175
3D body: height 2.5, standoff 0, extent -18.088,-2.1 18.088,2.1
3D body: height 2, standoff 0, extent 18.088,-3.568 19.415,3.632
3D body: height 2, standoff 0, extent -19.415,-3.568 -18.088,3.632
3D body: height 5, standoff 2.5, extent -18.088,-2.1 -16.129,2.132
3D body: height 5, standoff 2.5, extent 16.129,-2.1 18.088,2.132
3D body: height 5, standoff 2.5, extent -15.494,1.016 -14.605,1.524
3D body: height 5, standoff 2.5, extent -14.224,1.016 -13.335,1.524
3D body: height 5, standoff 2.5, extent -11.684,1.016 -10.795,1.524
3D body: height 5, standoff 2.5, extent -12.954,1.016 -12.065,1.524
3D body: height 5, standoff 2.5, extent -7.874,1.016 -6.985,1.524
3D body: height 5, standoff 2.5, extent -6.604,1.016 -5.715,1.524
3D body: height 5, standoff 2.5, extent -9.144,1.016 -8.255,1.524
3D body: height 5, standoff 2.5, extent -10.414,1.016 -9.525,1.524
3D body: height 5, standoff 2.5, extent -0.254,1.016 0.635,1.524
3D body: height 5, standoff 2.5, extent 1.016,1.016 1.905,1.524
3D body: height 5, standoff 2.5, extent 3.556,1.016 4.445,1.524
3D body: height 5, standoff 2.5, extent 2.286,1.016 3.175,1.524
3D body: height 5, standoff 2.5, extent -2.794,1.016 -1.905,1.524
3D body: height 5, standoff 2.5, extent -1.524,1.016 -0.635,1.524
3D body: height 5, standoff 2.5, extent -4.064,1.016 -3.175,1.524
3D body: height 5, standoff 2.5, extent -5.334,1.016 -4.445,1.524
3D body: height 5, standoff 2.5, extent 9.906,1.016 10.795,1.524
3D body: height 5, standoff 2.5, extent 11.176,1.016 12.065,1.524
3D body: height 5, standoff 2.5, extent 13.716,1.016 14.605,1.524
3D body: height 5, standoff 2.5, extent 12.446,1.016 13.335,1.524
3D body: height 5, standoff 2.5, extent 7.366,1.016 8.255,1.524
3D body: height 5, standoff 2.5, extent 8.636,1.016 9.525,1.524
3D body: height 5, standoff 2.5, extent 6.096,1.016 6.985,1.524
3D body: height 5, standoff 2.5, extent 4.826,1.016 5.715,1.524
3D body: height 5, standoff 2.5, extent 14.986,1.016 15.875,1.524
3D body: height 5, standoff 2.5, extent 14.605,-1.524 15.494,-1.016
3D body: height 5, standoff 2.5, extent 4.445,-1.524 5.334,-1.016
3D body: height 5, standoff 2.5, extent 5.715,-1.524 6.604,-1.016
3D body: height 5, standoff 2.5, extent 8.255,-1.524 9.144,-1.016
3D body: height 5, standoff 2.5, extent 6.985,-1.524 7.874,-1.016
3D body: height 5, standoff 2.5, extent 12.065,-1.524 12.954,-1.016
3D body: height 5, standoff 2.5, extent 13.335,-1.524 14.224,-1.016
3D body: height 5, standoff 2.5, extent 10.795,-1.524 11.684,-1.016
3D body: height 5, standoff 2.5, extent 9.525,-1.524 10.414,-1.016
3D body: height 5, standoff 2.5, extent -5.715,-1.524 -4.826,-1.016
3D body: height 5, standoff 2.5, extent -4.445,-1.524 -3.556,-1.016
3D body: height 5, standoff 2.5, extent -1.905,-1.524 -1.016,-1.016
3D body: height 5, standoff 2.5, extent -3.175,-1.524 -2.286,-1.016
3D body: height 5, standoff 2.5, extent 1.905,-1.524 2.794,-1.016
3D body: height 5, standoff 2.5, extent 3.175,-1.524 4.064,-1.016
3D body: height 5, standoff 2.5, extent 0.635,-1.524 1.524,-1.016
3D body: height 5, standoff 2.5, extent -0.635,-1.524 0.254,-1.016
3D body: height 5, standoff 2.5, extent -10.795,-1.524 -9.906,-1.016
3D body: height 5, standoff 2.5, extent -9.525,-1.524 -8.636,-1.016
3D body: height 5, standoff 2.5, extent -6.985,-1.524 -6.096,-1.016
3D body: height 5, standoff 2.5, extent -8.255,-1.524 -7.366,-1.016
3D body: height 5, standoff 2.5, extent -13.335,-1.524 -12.446,-1.016
3D body: height 5, standoff 2.5, extent -12.065,-1.524 -11.176,-1.016
3D body: height 5, standoff 2.5, extent -14.605,-1.524 -13.716,-1.016
3D body: height 5, standoff 2.5, extent -15.875,-1.524 -14.986,-1.016

## SMC50MPCBH [mm] "ERNI SMC50 pin MALE HOR"
height 4.2
pads (56):
  rect 0.8x0.8 smd: A1(-15.24,-2.007) A2(-13.97,-2.007) A3(-12.7,-2.007) A4(-11.43,-2.007) A5(-10.16,-2.007) A6(-8.89,-2.007) A7(-7.62,-2.007) A8(-6.35,-2.007) A9(-5.08,-2.007) A10(-3.81,-2.007) A11(-2.54,-2.007) A12(-1.27,-2.007) A13(0,-2.007) A14(1.27,-2.007) A15(2.54,-2.007) A16(3.81,-2.007) A17(5.08,-2.007) A18(6.35,-2.007) A19(7.62,-2.007) A20(8.89,-2.007) A21(10.16,-2.007) A22(11.43,-2.007) A23(12.7,-2.007) A24(13.97,-2.007) A25(15.24,-2.007) B1(-15.24,-3.277) B2(-13.97,-3.277) B3(-12.7,-3.277) B4(-11.43,-3.277) B5(-10.16,-3.277) B6(-8.89,-3.277) B7(-7.62,-3.277) B8(-6.35,-3.277) B9(-5.08,-3.277) B10(-3.81,-3.277) B11(-2.54,-3.277) B12(-1.27,-3.277) B13(0,-3.277) B14(1.27,-3.277) B15(2.54,-3.277) B16(3.81,-3.277) B17(5.08,-3.277) B18(6.35,-3.277) B19(7.62,-3.277) B20(8.89,-3.277) B21(10.16,-3.277) B22(11.43,-3.277) B23(12.7,-3.277) B24(13.97,-3.277) B25(15.24,-3.277)
  round 0 hole 1.6 unplated: MH1(-17.45,0) MH2(17.45,0)
  rect 1.219x2.54 smd: MP1(-17.805,-2.54) MP2(-17.805,2.54) MP3(17.875,-2.54) MP4(17.875,2.54)
Top Overlay:
  circle w0.15: c-16.18,-2.032 r0.152
  lines w0.15: -18.669,3.683 -18.669,-4.064 18.739,-4.064 18.739,3.683
Mechanical 13:
  drawing of 238 lines, arcs and shapes, not listed
Mechanical 15:
  lines w0.102: -0.635,0 0.635,0 ; 0,-0.635 0,0.635
3D body "SMC-054596.stp": height 4.27, standoff -0.68, extent -18.35,-3.619 18.35,6.381

## SMC50MPCBV [mm] "ERNI SMC 50 pin MALE VERT"
pads (56):
  rect 0.8x1.1 smd: A1(15.24,-2.743) A2(13.97,-2.743) A3(12.7,-2.743) A4(11.43,-2.743) A5(10.16,-2.743) A6(8.89,-2.743) A7(7.62,-2.743) A8(6.35,-2.743) A9(5.08,-2.743) A10(3.81,-2.743) A11(2.54,-2.743) A12(1.27,-2.743) A13(0,-2.743) A14(-1.27,-2.743) A15(-2.54,-2.743) A16(-3.81,-2.743) A17(-5.08,-2.743) A18(-6.35,-2.743) A19(-7.62,-2.743) A20(-8.89,-2.743) A21(-10.16,-2.743) A22(-11.43,-2.743) A23(-12.7,-2.743) A24(-13.97,-2.743) A25(-15.24,-2.743) B1(15.24,2.743) B2(13.97,2.743) B3(12.7,2.743) B4(11.43,2.743) B5(10.16,2.743) B6(8.89,2.743) B7(7.62,2.743) B8(6.35,2.743) B9(5.08,2.743) B10(3.81,2.743) B11(2.54,2.743) B12(1.27,2.743) B13(0,2.743) B14(-1.27,2.743) B15(-2.54,2.743) B16(-3.81,2.743) B17(-5.08,2.743) B18(-6.35,2.743) B19(-7.62,2.743) B20(-8.89,2.743) B21(-10.16,2.743) B22(-11.43,2.743) B23(-12.7,2.743) B24(-13.97,2.743) B25(-15.24,2.743)
  round 0 hole 1.6 unplated: MH1(-17.45,0) MH2(17.45,0)
  rect 1.2x2.5 smd: MP1(17.907,-2.54) MP2(17.907,2.54) MP3(-17.907,2.54) MP4(-17.907,-2.54)
Top Overlay:
  lines w0.15: -18.669,-3.683 -18.669,3.683 ; 18.669,-3.683 18.669,3.683
  text "B1" at 16.002,3.81 h0.89
  text "A1" at 16.002,-2.794 h0.89
Mechanical 13:
  drawing of 242 lines, arcs and shapes, not listed
Mechanical 15:
  lines w0.102: -0.508,0 0.508,0 ; 0,-0.508 0,0.508
3D body: height 2, standoff 0, extent -18.4,-3.6 -16.825,3.6
3D body: height 2, standoff 0, extent 16.825,-3.6 18.4,3.6
3D body: height 9, standoff 0, extent -17.225,-2.1 17.225,2.1
3D body: height 3, standoff 0, extent -16.55,-1.35 16.55,1.325

## SOLDERJUMPER [mil] "PCB solder jumper"
pads (3):
  round 10 smd paste-20 mask-20: 1(-20,0) 2(20,0)
  oval 96x88 on Top Solder mask+0: ""(0,0)
Top Layer:
  region: -4,36.96 -4,-36.96 -7.65,-40.38 -9.8,-40.24 -15,-39.2 -20.03,-37.5 -24.79,-35.15 -29.21,-32.2 -33.2,-28.7 -36.7,-24.71 -39.65,-20.29 -42,-15.53 -43.7,-10.5 -44.74,-5.3 -45.09,0 -44.74,5.3 -43.7,10.5 -42,15.53 -39.65,20.29 -36.7,24.71 -33.2,28.7 -29.21,32.2 -24.79,35.15 -20.03,37.5 -15,39.2 -9.8,40.24 -7.65,40.38
  region: 4,36.96 4,-36.96 7.65,-40.38 9.8,-40.24 15,-39.2 20.03,-37.5 24.79,-35.15 29.21,-32.2 33.2,-28.7 36.7,-24.71 39.65,-20.29 42,-15.53 43.7,-10.5 44.74,-5.3 45.09,0 44.74,5.3 43.7,10.5 42,15.53 39.65,20.29 36.7,24.71 33.2,28.7 29.21,32.2 24.79,35.15 20.03,37.5 15,39.2 9.8,40.24 7.65,40.38
Top Overlay:
  lines w5.91: -4,-47 cw(c-4,0) -4,47 4,47 cw(c4,0) 4,-47 -4,-47
Mechanical 13:
  lines w4: -4,-47 cw(c-4,0) -4,47 ; 4,-47 ccw(c4,0) 4,47
  lines w4.02: -4,-47 4,-47 ; -4,47 4,47 ; 0,-47 0,47